# Altium footprint library BARKO_PCBLIB.PcbLib: 531 footprints (part 20 of 34)
Each footprint in its own frame and in the unit in brackets; x right, y up, seen from the top. Pads: shape width x height; smd on the part's side, far side on the other; paste and mask are expansions set on the pad; w line width, h text height; cw(c..) or ccw(c..) is an arc to the next point about the centre after c.
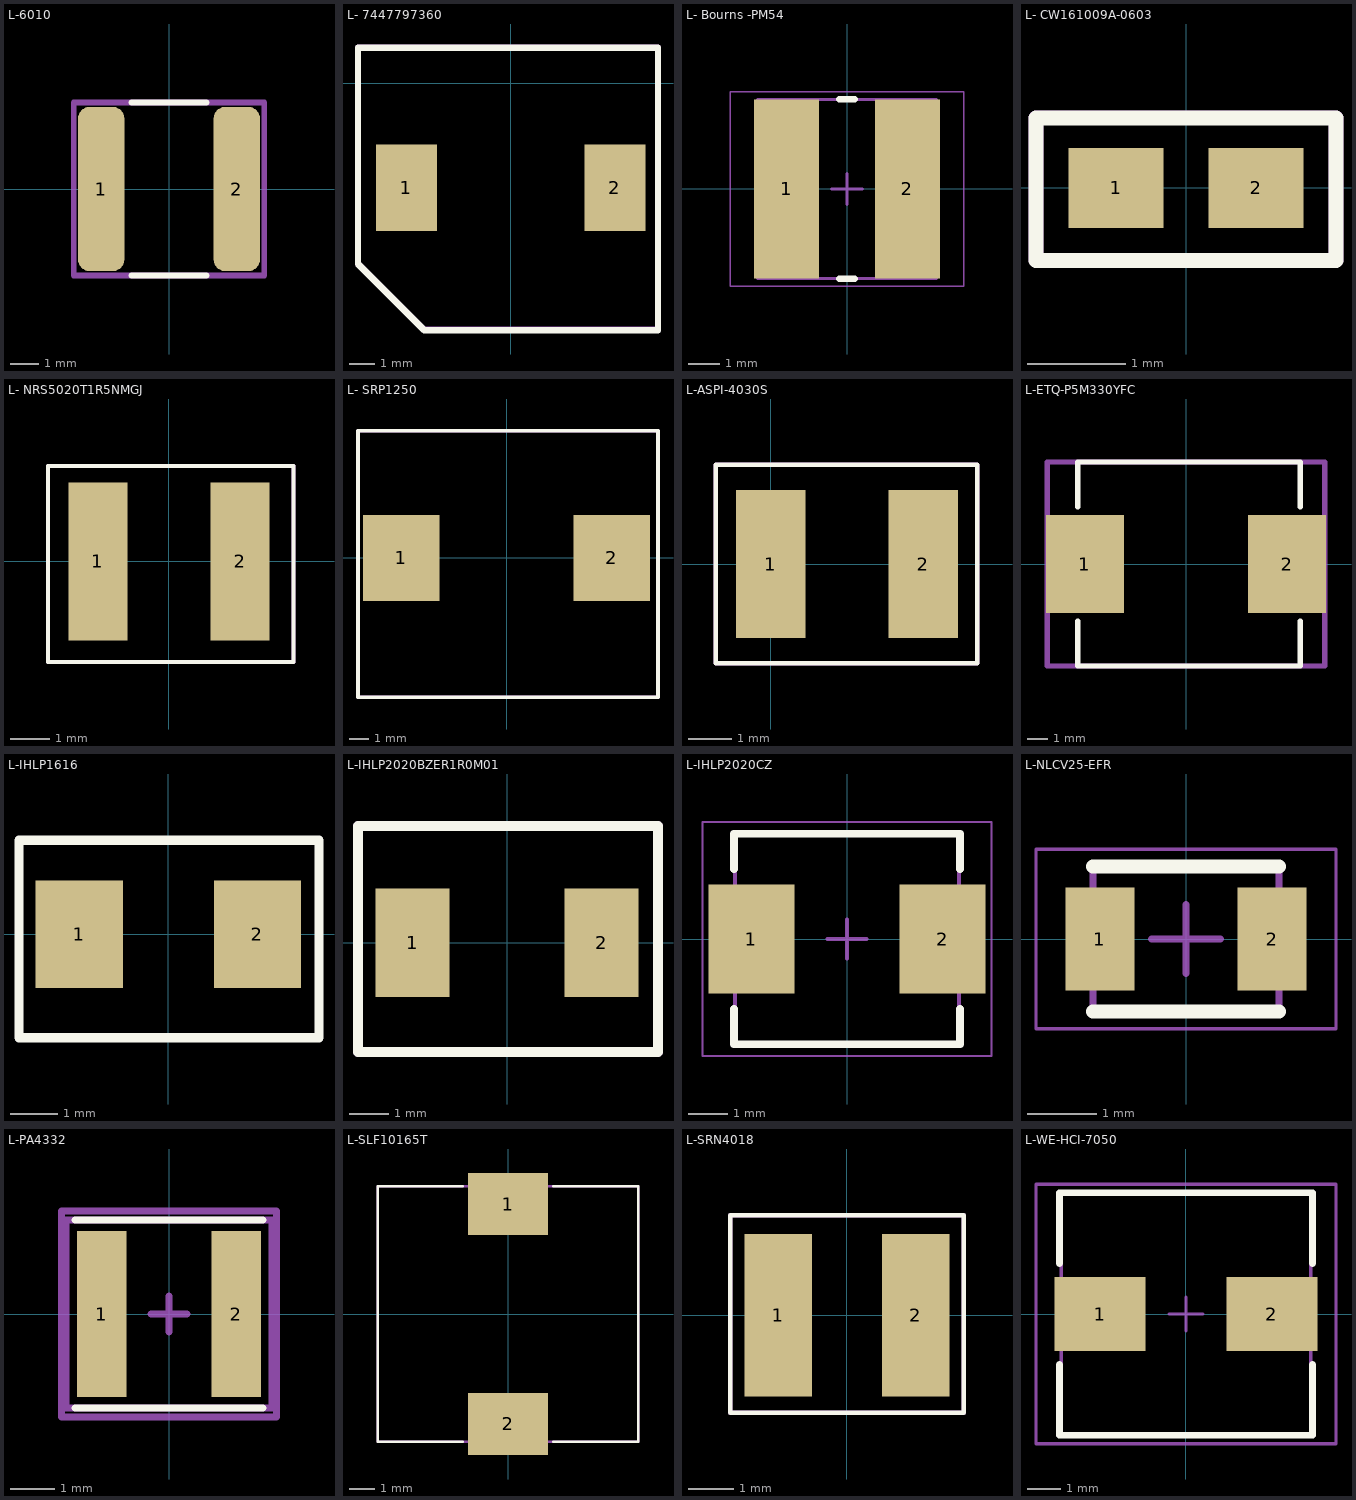
[diagram p19: the footprints below, top view; thin cyan lines are the x and y axes]

## L-6010 [mm] "2 Leads,  6mm X 6mm"
height 1
pads (2):
  rrect50% 1.6x5.7 smd: 1(-2.35,0) 2(2.35,0)
Top Overlay:
  lines w0.2: -1.3,-3 1.3,-3 ; -1.3,3 1.3,3
ASM Top:
  lines w0.2: -3.3,-3 -3.3,3 3.3,3 3.3,-3 -3.3,-3
  text ".designator" at -0.9,-0.3 h0.8
3D body "User Library-DJNR6028.STEP": height 2.58, standoff 0, extent -3,-3.073 3,3.073

## L- 7447797360 [mm]
pads (2):
  rect 2.4x3.4 smd: 1(-4.1,-4.1) 2(4.1,-4.1)
Top Overlay:
  lines w0.254: -6,-5.114 -6,1.4 5.8,1.4 5.8,-9.7 ; -6,-5.1 -6,-7.1 -3.4,-9.7 -3.1,-9.7 5.8,-9.7 ; 5.8,-9.7 5.765,-9.7 5.8,-9.7
ASM Top:
  lines w0.254: -6,-5.099 -6,1.4 5.8,1.4 5.8,-9.685 ; -6,-5.085 -6,-7.085 -3.4,-9.685 -3.1,-9.685 5.8,-9.685 ; 5.8,-9.685 5.765,-9.685 5.8,-9.685
  text ".designator" at 0.4,-5 h0.8
3D body "7447797022_Download_STP_WE-PDF-1045_rev1.stp": height 4.45, standoff -0.05, extent -5.1,-9.2 5.1,1

## L- Bourns -PM54 [mm] "Precision Wire Wound Inductor, 2-Leads, Body 5,80x5,80mm, IPC Medium Density"
height 4.8
pads (2):
  rect 2.1x5.8 smd: 1(-1.95,0) 2(1.95,0)
Top Overlay:
  lines w0.2: -0.25,-2.9 0.25,-2.9 ; -0.25,2.9 0.25,2.9
Mechanical 15:
  lines w0.05: -3.775,-3.15 3.775,-3.15 3.775,3.15 -3.775,3.15 -3.775,-3.15
  lines w0.1: -0.5,0 0.5,0 ; 0,-0.5 0,0.5
ASM Top:
  lines w0.1: -2.9,-2.9 -2.9,2.9 2.9,2.9 2.9,-2.9 -2.9,-2.9
  text ".designator" at -0.2,-0.1 h0.8
3D body "pm54.stp": height 4.81, standoff 0.01, extent -2.9,-2.9 2.9,2.9

## L- CW161009A-0603 [mil]
pads (2):
  rect 38x32 smd mask+1.97: 1(-28,0)
  rect 38x32 smd paste-100 mask+1.97: 2(28,0)
Top Overlay:
  lines w6: -60,-29 -60,28 60,28 60,-29 -60,-29
Top Paste:
  region: 14,-1 44,-1 44,-10 14,-10
  region: 14,13 44,13 44,4 14,4
ASM Top:
  lines w5.91: -60,-29 -60,28 60,28 60,-29 -60,-29
  text ".designator" at -26,-7 h31.5
3D body "CW161009A.stp": height 37.47, standoff -3.44, extent -33.25,-22.34 35.25,23

## L- NRS5020T1R5NMGJ [mm]
pads (2):
  rect 1.5x4 smd: 1(-1.8,0) 2(1.8,0)
Top Overlay:
  lines w0.102: -3.07,-2.54 -3.07,2.413 3.153,2.413 3.153,-2.54 -3.07,-2.54
ASM Top:
  lines w0.102: -3.07,-2.54 3.153,-2.54 3.153,2.413 -3.07,2.413 -3.07,-2.54
  text ".designator" at -0.7,-0.2 h0.8
3D body "NRS5020T1R5NMGJ .STEP": height 3.01, standoff 0.01, extent -2.45,-2.512 2.45,2.388

## L- SRP1250 [mm]
pads (2):
  rect 4x4.5 smd: 1(-5.5,0) 2(5.5,0)
Top Overlay:
  lines w0.2: -7.772,-7.29 -7.772,6.655 7.925,6.655 7.925,-7.29 -7.772,-7.29
ASM Top:
  lines w0.2: -7.772,-7.29 7.925,-7.29 7.925,6.655 -7.772,6.655 -7.772,-7.29
  text ".designator" at -0.7,-0.2 h0.8
3D body "srp1250.stp": height 5.91, standoff 0.01, extent -6.963,-7.055 6.937,6.445

## L-ASPI-4030S [mil]
pads (2):
  rect 63x134 smd: 1(0,0) 2(138,0)
Top Overlay:
  lines w4: -50,-90 187,-90 187,90 -50,90 -50,-90
ASM Top:
  lines w4: -50,-90 -50,90 187,90 187,-90 -50,-90
  text ".designator" at -31,-52 h31.5
3D body "ASPI-4030S.STEP": height 118.62, standoff 0.5, extent -5.74,-78.73 151.74,78.75

## L-ETQ-P5M330YFC [mm]
pads (2):
  rect 3.8x4.8 smd: 1(-4.95,0) 2(4.95,0)
Top Overlay:
  lines w0.254: -5.3,-2.8 -5.3,-5 5.6,-5 5.6,-2.8 ; -5.3,2.8 -5.3,5 5.6,5 5.6,2.8
ASM Top:
  lines w0.254: -6.8,-4.962 -6.762,-5 6.8,-5 6.8,5 -6.8,5 -6.8,-5 -6.8,-4.924
  text ".designator" at -1,-0.3 h0.8
3D body "PCC-M1054M.STEP": height 5.4, standoff 0.01, extent -5.3,-5 5.6,5

## L-IHLP1616 [mil]
pads (2):
  rect 73x90 smd: 1(-74.5,0) 2(74.5,0)
Top Overlay:
  lines w7.87: -125,-86.61 -125,78.74 125.98,78.74 125.98,-86.61 -125,-86.61
ASM Top:
  lines w4: -125,-86.61 125.98,-86.61 125.98,78.74 -125,78.74 -125,-86.61
  text ".designator" at -109,-41 h31.5
3D body "IHLP-1616BZ-01.STEP": height 79.24, standoff 0.5, extent -87,-82.92 88.19,76.92

## L-IHLP2020BZER1R0M01 [mm]
pads (2):
  rect 1.905x2.79 smd: 1(-2.425,0) 2(2.426,0)
Top Overlay:
  lines w0.254: -3.825,-2.8 -3.825,3 3.875,3 3.875,-2.8 -3.825,-2.8
ASM Top:
  lines w0.254: -3.825,-2.8 3.875,-2.8 3.875,3 -3.825,3 -3.825,-2.8
  text ".designator" at -0.5,-0.1 h0.8
3D body "IHLP-2020BZ-01.STEP": height 2.01, standoff 0.01, extent -2.67,-2.49 2.82,2.69

## L-IHLP2020CZ [mm] "Precision Wire Wound Inductor, 2-Leads, Body 5,49x5,18mm, IPC Medium Density"
height 3
pads (2):
  rect 2.2x2.79 smd: 1(-2.45,0) 2(2.45,0)
Top Overlay:
  lines w0.2: -2.9,-1.795 -2.9,-2.7 2.9,-2.7 2.9,-1.795 ; -2.9,1.795 -2.9,2.7 2.9,2.7 2.9,1.795
Mechanical 15:
  lines w0.05: -3.7,-3 3.7,-3 3.7,3 -3.7,3 -3.7,-3
  lines w0.1: -0.5,0 0.5,0 ; 0,-0.5 0,0.5
ASM Top:
  lines w0.1: -2.87,-2.715 2.87,-2.715 2.87,2.715 -2.87,2.715 -2.87,-2.715
  text ".designator" at -2.4,-0.2 h0.8
3D body "L-IHLP2020CZ.step": height 3.1, standoff 0, extent -2.845,-2.59 2.845,2.59

## L-NLCV25-EFR [mm] "TDK NLCV25-EFR Series"
height 1.9
pads (2):
  rect 1x1.5 smd: 1(-1.25,0) 2(1.25,0)
Top Overlay:
  lines w0.2: -1.35,-1.05 1.35,-1.05 ; -1.35,1.05 1.35,1.05
Mechanical 15:
  lines w0.05: -2.175,-1.3 2.175,-1.3 2.175,1.3 -2.175,1.3 -2.175,-1.3
  lines w0.1: -0.5,0 0.5,0 ; 0,-0.5 0,0.5
ASM Top:
  lines w0.1: -1.35,-1.05 1.35,-1.05 1.35,1.05 -1.35,1.05 -1.35,-1.05
  text ".designator" at -1.2,-0.6 h0.8
3D body "L-NLCV25-EFR.step": height 2, standoff 0, extent -1.35,-1 1.35,1

## L-PA4332 [mm]
height 2
pads (2):
  rect 1.1x3.7 smd: 1(-1.5,0) 2(1.5,0)
Top Overlay:
  lines w0.15: -2.1,-2.1 2.1,-2.1 ; -2.1,2.1 2.1,2.1
Mechanical 15:
  lines w0.15: -0.4,0 0.4,0 ; 0,-0.4 0,0.4 ; -2.4,-2.3 -2.4,2.3 2.4,2.3 2.4,-2.3 2.1,-2.3 -2.4,-2.3
ASM Top:
  lines w0.15: -2.3,-2.1 -2.3,2.1 2.3,2.1 2.3,-2.1 -2.3,-2.1
  text ".designator" at -0.3,-0.3 h1.5
3D body "Ind_Pulse_PA4332_102NLT_eec.STEP": height 2, standoff 0, extent -2.1,-2.1 2.1,2.1

## L-SLF10165T [mil]
pads (2):
  rect 126x98 smd: 1(0,173) 2(0,-173)
Top Overlay:
  lines w4: -71,-201 -205,-201 -205,201 -71,201 ; 71,-201 205,-201 205,201 71,201
ASM Top:
  lines w4: -205,-201 -205,201 205,201 205,-201 -205,-201
  text ".designator" at -3.94,-3.94 h31.5
3D body "SLF10165T-100M3R8-3PF.stp": height 268.22, standoff 0.5, extent -198.82,-198.82 198.82,198.82

## L-SRN4018 [mm]
pads (2):
  rect 1.5x3.6 smd: 1(-1.525,0) 2(1.525,0)
Top Overlay:
  lines w0.102: -2.591,-2.159 2.591,-2.159 2.591,2.21 -2.591,2.21 -2.591,-2.159
ASM Top:
  lines w0.102: -2.591,-2.159 -2.591,2.21 2.591,2.21 2.591,-2.159 -2.591,-2.159
  text ".designator" at -2.134,-0.711 h0.8
3D body "srn4018.stp": height 1.81, standoff 0.01, extent -2.225,-2 2.175,2

## L-WE-HCI-7050 [mm] "SMD Inductor, 2-Leads, Body 7.0 x 6.9 mm"
height 5
pads (2):
  rect 2.7x2.2 smd: 1(-2.55,0) 2(2.55,0)
Top Overlay:
  lines w0.2: -3.75,-1.5 -3.75,-3.6 3.75,-3.6 3.75,-1.5 ; -3.75,1.5 -3.75,3.6 3.75,3.6 3.75,1.5
Mechanical 15:
  lines w0.1: -0.5,0 0.5,0 ; 0,-0.5 0,0.5 ; -4.45,-3.85 -4.45,3.85 4.45,3.85 4.45,-3.85 -4.45,-3.85
ASM Top:
  lines w0.1: -3.7,-3.6 -3.7,3.6 3.7,3.6 3.7,-3.6 -3.7,-3.6
  text ".designator" at -0.406,-0.203 h0.8
3D body "744314200.stp": height 4.98, standoff -0.02, extent -3.5,-3.45 3.5,3.45